# Altium footprint library Generators.PcbLib: 11 footprints
Each footprint in its own frame and in the unit in brackets; x right, y up, seen from the top. Pads: shape width x height; smd on the part's side, far side on the other; paste and mask are expansions set on the pad; w line width, h text height; cw(c..) or ccw(c..) is an arc to the next point about the centre after c.
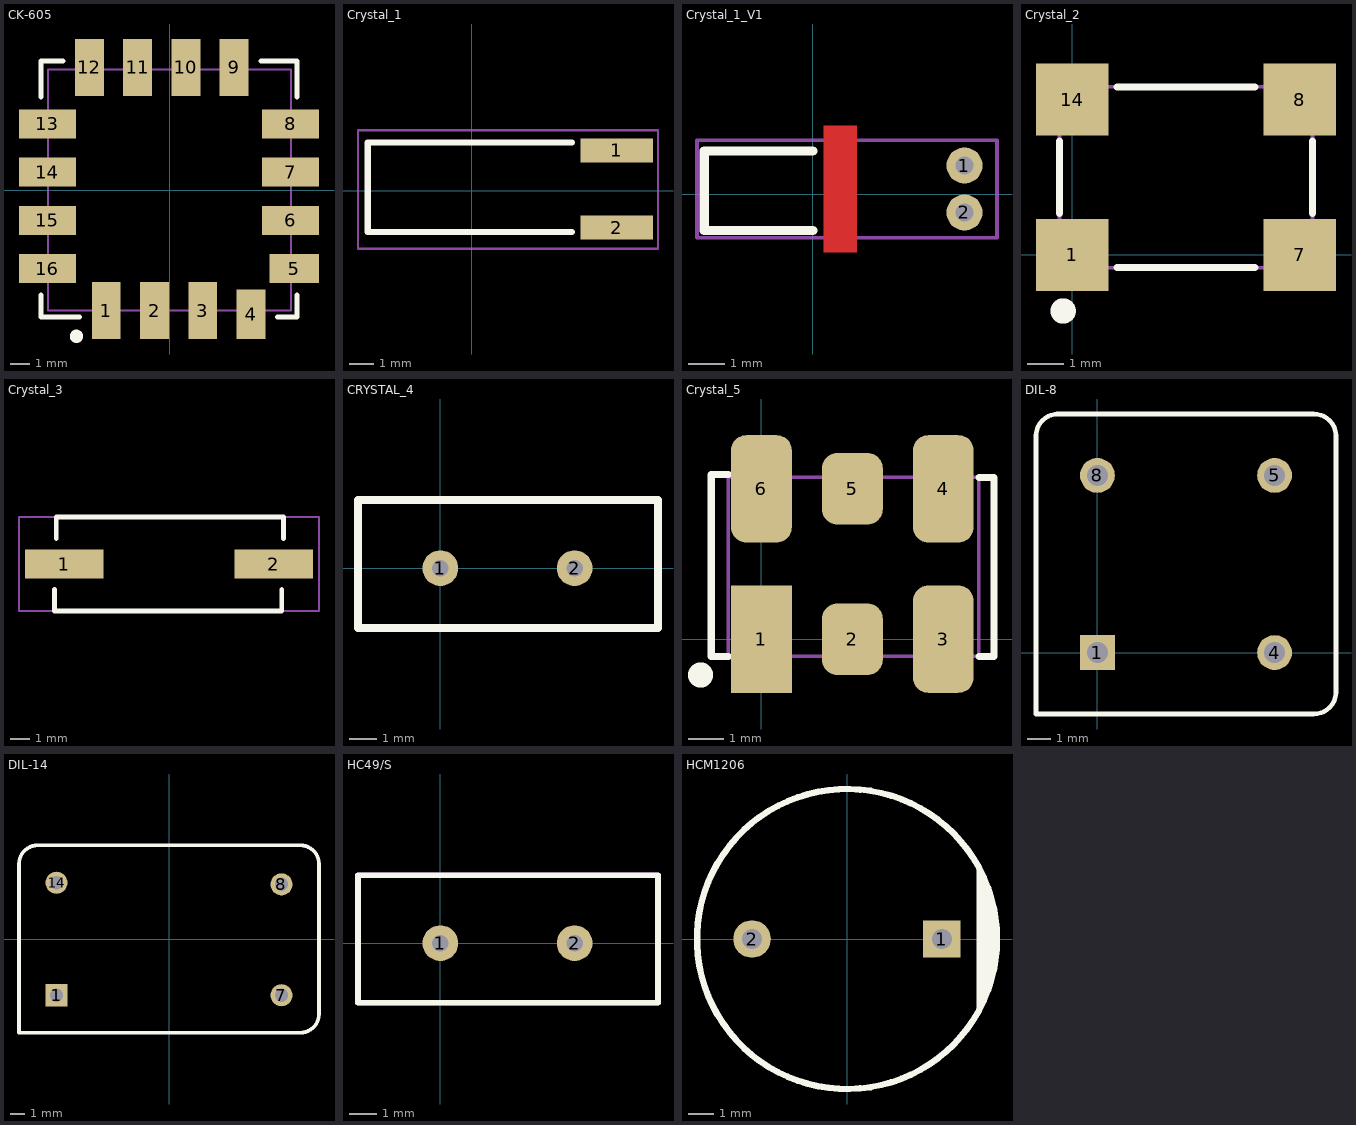
[diagram p0: the footprints below, top view; thin cyan lines are the x and y axes]

## CK-605 [mm]
height 5
pads (16):
  rect 1.52x3 smd: 1(-3.331,-6.342) 2(-0.791,-6.342) 3(1.749,-6.342) 9(3.4,6.45) 10(0.86,6.45) 11(-1.68,6.45) 12(-4.22,6.45)
  rect 1.52x2.6 smd: 4(4.289,-6.542)
  rect 2.6x1.52 smd: 5(6.567,-4.137)
  rect 3x1.52 smd: 6(6.367,-1.597) 7(6.367,0.943) 8(6.367,3.483) 13(-6.425,3.483) 14(-6.425,0.943) 15(-6.425,-1.597) 16(-6.425,-4.137)
Top Overlay:
  circle w0.5: c-4.9,-7.7 r0.1
  lines w0.254: -6.76,-5.534 -6.76,-6.677 -4.728,-6.677 ; -6.76,4.88 -6.76,6.785 -5.617,6.785 ; 4.797,6.785 6.702,6.785 6.702,4.88 ; 5.686,-6.677 6.702,-6.677 6.702,-5.534
Mechanical 13:
  lines w0.1: -6.4,-6.35 6.4,-6.35 6.4,6.35 -6.4,6.35 -6.4,-6.35
3D body: height 4.57, standoff 0, extent -6.35,-6.35 6.35,6.35

## Crystal_1 [mm]
height 5
pads (2):
  rect 3x1 smd: 1(6,1.663) 2(6,-1.52)
Top Overlay:
  lines w0.254: 4.14,-1.702 2.14,-1.702 -4.3,-1.702 -4.3,2 2.14,2 4.14,2
Mechanical 29:
  lines w0.1: -4.7,-2.4 7.7,-2.4 7.7,2.5 -4.7,2.5 -4.7,-2.4
  text ".Designator" at -1.3,-0.2 h1
3D body: height 3.1, standoff -0.1, extent -4.6,-1.525 6.175,1.925

## Crystal_1_V1 [mm]
height 5
pads (2):
  round 1 hole 0.5 unplated: 1(4.2,0.8) 2(4.2,-0.5)
Top Layer:
  rectangle: 0.3,-1.6 1.228,1.9
Top Overlay:
  lines w0.254: 0,-1 -3,-1 -3,1.2 0,1.2
Mechanical 29:
  lines w0.1: -3.2,-1.2 -3.2,1.5 5.1,1.5 5.1,-1.2 -3.2,-1.2
  text ".Designator" at -1.3,-0.2 h1
3D body: height 2.5, standoff -1.5, extent -2.87,-0.9 4.27,1.1

## Crystal_2 [mm]
height 5
pads (4):
  rect 2x2 smd: 1(0,0) 7(6.3,0) 8(6.3,4.3) 14(0,4.3)
Top Overlay:
  circle w0.5: c-0.25,-1.55 r0.1
  lines w0.2: -0.35,1.15 -0.35,3.15 ; 1.25,-0.35 5.05,-0.35 ; 1.25,4.65 5.05,4.65 ; 6.65,1.15 6.65,3.15
Mechanical 13:
  lines w0.1: -0.35,-0.35 6.65,-0.35 6.65,4.65 -0.35,4.65 -0.35,-0.35
3D body: height 1.8, standoff 0, extent -0.35,-0.35 6.65,4.73

## Crystal_3 [mm]
height 5
pads (2):
  rect 4x1.5 smd: 1(7,-9.3) 2(17.7,-9.3)
Top Overlay:
  lines w0.254: 6.5,-10.6 6.5,-11.7 18.1,-11.7 18.1,-10.6 ; 6.6,-8 6.6,-6.9 18.2,-6.9 18.2,-8
Mechanical 29:
  lines w0.1: 4.7,-11.7 4.7,-6.9 20,-6.9 20,-11.7 4.7,-11.7
  text ".Designator" at 9.4,-9.7 h1.5
3D body: height 4.3, standoff 0, extent 5.8,-11.7 19,-6.9

## CRYSTAL_4 [mm]
pads (2):
  round 1.3 hole 0.6: 1(0,0) 2(4.88,0)
Top Overlay:
  lines w0.3: -2.992,2.477 7.908,2.477 7.908,-2.173 -2.992,-2.173 -2.992,2.45 -2.95,2.45
3D body: height 14.9, standoff -1.1, extent -2.992,-2.173 7.908,2.477

## Crystal_5 [mm]
height 5
pads (6):
  rect 1.7x3 smd: 1(0,0)
  rrect50% 1.7x2 smd: 2(2.54,0) 5(2.54,4.2)
  rrect50% 1.7x3 smd: 3(5.08,0) 4(5.08,4.2) 6(0,4.2)
Top Overlay:
  circle w0.5: c-1.7,-1 r0.1
  lines w0.2: -0.924,-0.48 -1.4,-0.48 -1.4,4.6 -0.924,4.6 ; 6.076,-0.48 6.5,-0.48 6.5,4.52 6.076,4.52
Mechanical 13:
  lines w0.1: -0.924,-0.48 6.076,-0.48 6.076,4.52 -0.924,4.52 -0.924,-0.48
3D body: height 1.8, standoff 0, extent -0.924,-0.48 6.076,4.6

## DIL-8 [mm]
height 10
pads (4):
  rect 1.5x1.5 hole 0.9: 1(0,0)
  round 1.5 hole 0.9: 4(7.62,0) 5(7.62,7.62) 8(0,7.62)
Top Overlay:
  lines w0.2: -2.64,9.31 cw(c-1.69,9.31) -1.69,10.26 ; -2.64,9.36 -2.64,-2.64 9.26,-2.64 ; -1.74,10.26 9.31,10.26 cw(c9.31,9.31) 10.26,9.31 10.26,-1.64 ; 9.31,-2.64 ccw(c9.31,-1.69) 10.26,-1.69
3D body: height 5.3, standoff -1.3, extent -2.54,-2.54 10.16,10.16

## DIL-14 [mm]
height 5
pads (4):
  rect 1.5x1.5 hole 0.9: 1(-7.62,-3.81)
  round 1.5 hole 0.9: 7(7.62,-3.81) 8(7.62,3.7) 14(-7.62,3.81)
Top Overlay:
  lines w0.254: -10.16,-6.35 8.89,-6.35 ccw(c8.89,-5.08) 10.16,-5.08 10.16,5.08 ccw(c8.89,5.08) 8.89,6.35 -8.89,6.35 ccw(c-8.89,5.08) -10.16,5.08 -10.16,-6.35
3D body: height 5.6, standoff -1, extent -10.2,-6.45 10,6.25

## HC49/S [mm]
pads (2):
  round 1.3 hole 0.6: 1(0,0) 2(4.88,0)
Top Overlay:
  lines w0.2: -2.992,-2.173 -2.992,2.477 7.908,2.477 7.908,-2.173 -2.992,-2.173
Mechanical 29:
  lines w0.2: -2.992,-2.173 -2.992,2.477 7.908,2.477 7.908,-2.173 -2.992,-2.173
  text ".Designator" at -1.8,-0.5 h2
3D body: height 5, standoff -1.5, extent -2.942,-2.098 7.858,2.402

## HCM1206 [mm]
height 5
pads (2):
  rect 1.5x1.5 hole 0.8: 1(3.8,0)
  round 1.5 hole 0.8: 2(-3.8,0)
Top Overlay:
  circle w0.254: c0,0 r6
  lines w0.254: 5.3,-2.8 5.3,2.8 ; 5.4,-2.2 5.4,2.3 ; 5.6,-2 5.6,2 ; 5.7,-1.7 5.7,1.6 ; 5.9,-0.8 5.9,0.9
3D body: height 10.5, standoff -5.5, extent -6,-6 6,6